# Altium footprint library OT Library.PcbLib: 396 footprints (part 17 of 25)
Each footprint in its own frame and in the unit in brackets; x right, y up, seen from the top. Pads: shape width x height; smd on the part's side, far side on the other; paste and mask are expansions set on the pad; w line width, h text height; cw(c..) or ccw(c..) is an arc to the next point about the centre after c.
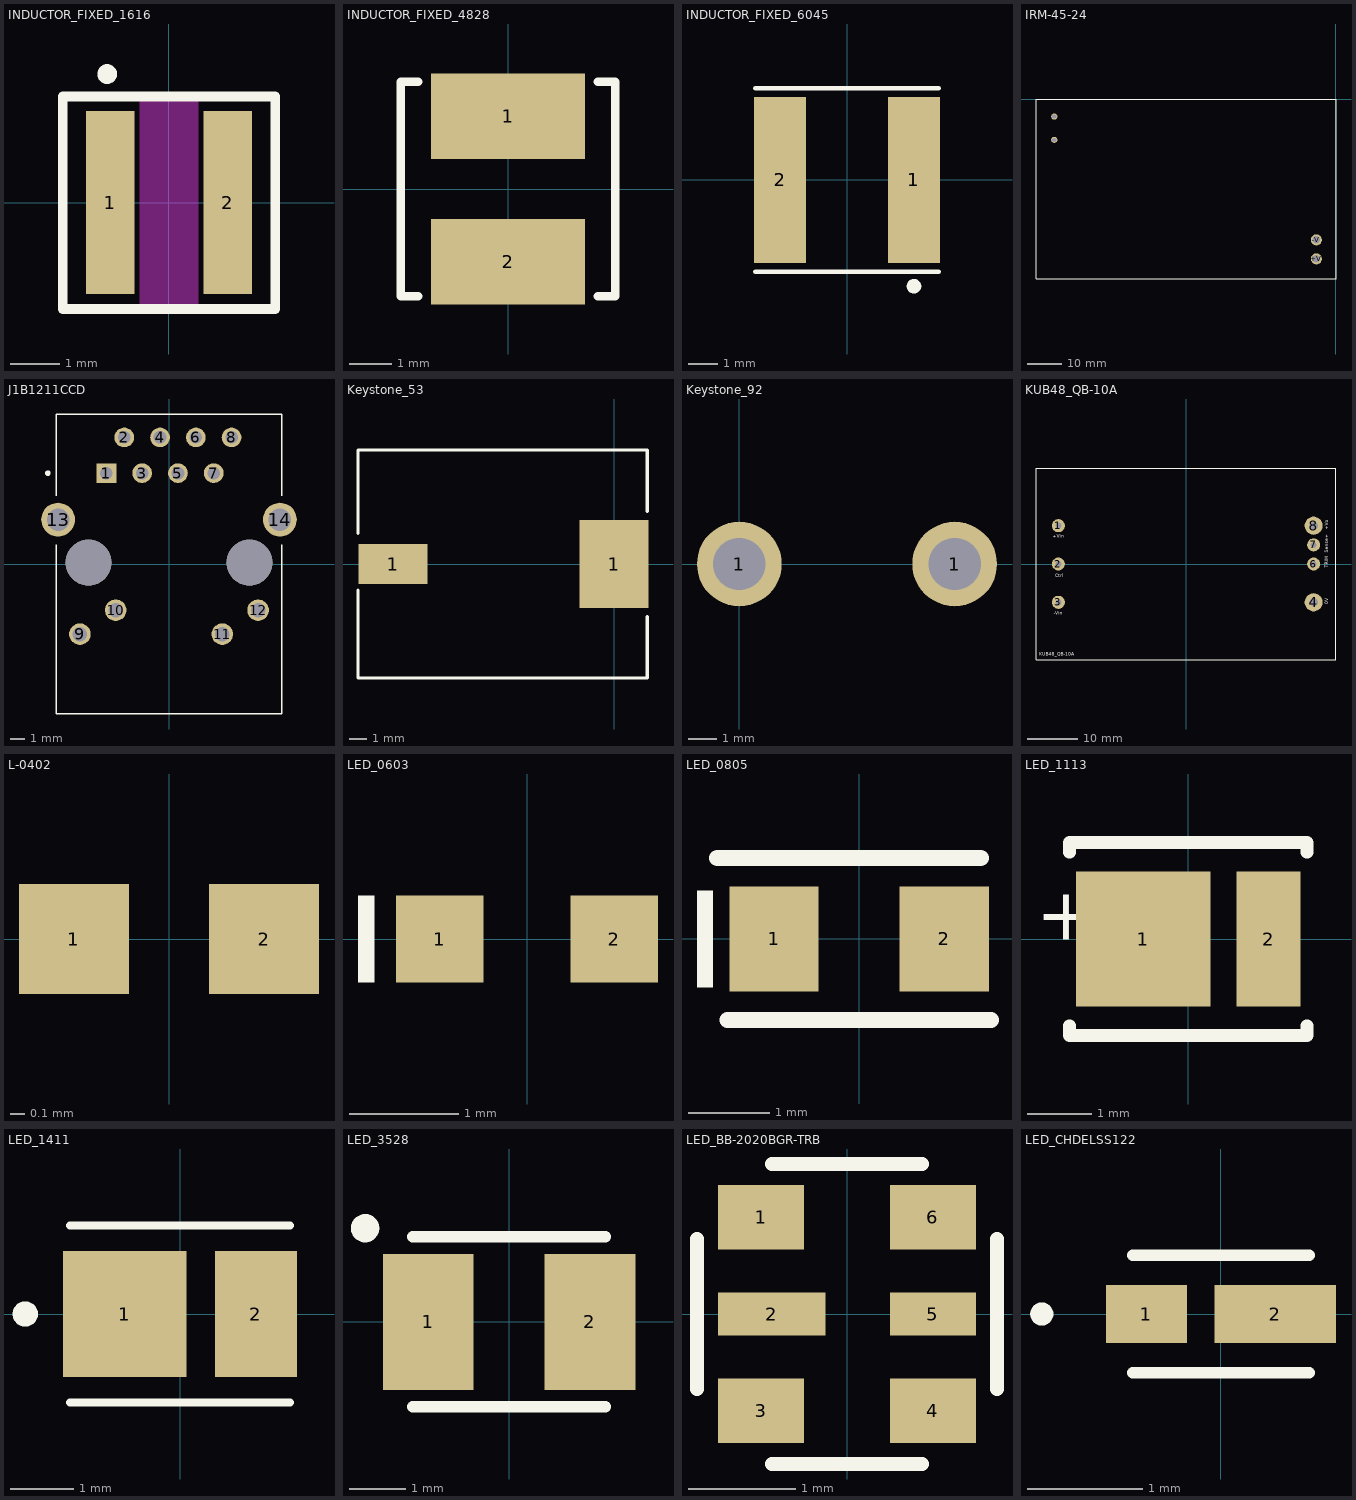
[diagram p16: the footprints below, top view; thin cyan lines are the x and y axes]

## INDUCTOR_FIXED_1616 [mm] "0.161\" L x 0.161\" W (4.10mm x 4.10mm)"
height 2.1
pads (2):
  rect 0.98x3.7 smd: 1(-1.185,0) 2(1.185,0)
Top Layer keep-out:
  region: -0.595,2.05 0.595,2.05 0.595,-2.05 -0.595,-2.05
Top Overlay:
  circle w0.2: c-1.25,2.6 r0.1
  lines w0.2: -2.15,-2.15 -2.15,2.15 2.15,2.15 2.15,-2.15 -2.15,-2.15
3D body: height 2.1, standoff 0, extent -2.05,-2.05 2.05,2.05

## INDUCTOR_FIXED_4828 [mm] "SMT Power Inductor, body 4.8x4.8mm"
height 2.8
pads (2):
  rect 3.6x2 smd: 1(0,1.7) 2(0,-1.7)
Top Overlay:
  lines w0.2: -2.1,-2.5 -2.5,-2.5 -2.5,2.5 -2.1,2.5 ; 2.1,-2.5 2.5,-2.5 2.5,2.5 2.1,2.5
3D body: height 2.8, standoff 0, extent -2.4,-2.4 2.4,2.4

## INDUCTOR_FIXED_6045 [mm] "SMD Power Inductor, 2-Leads, body 6x6mm"
height 4.5
pads (2):
  rect 1.8x5.7 smd: 1(2.3,0) 2(-2.3,0)
Top Overlay:
  circle w0.25: c2.3,-3.65 r0.125
  lines w0.15: -3.15,-3.15 3.15,-3.15 ; -3.15,3.15 3.15,3.15
3D body: height 4.52, standoff 0.02, extent -3,-3 3,3

## IRM-45-24 [mm]
pads (4):
  round 3.216 hole 2.2: +V(-5.7,-46.25) -V(-5.7,-40.75)
  round 1.8 hole 1.2: AC/L(-81.7,-5) AC/N(-81.7,-11.75)
Top Overlay:
  lines w0.2: -86.995,-52 0.005,-52 0.005,0 -86.995,0 -86.995,-52
3D body: height 29.5, standoff -3.5, extent -86.934,-51.731 0.066,0.269

## J1B1211CCD [mm]
pads (16):
  rect 1.4x1.4 / inner round 1.4 / far side rect 1.4x1.4 hole 0.9: 1(-4.445,6.45)
  round 1.4 hole 0.9: 2(-3.175,8.99) 3(-1.905,6.45) 4(-0.635,8.99) 5(0.635,6.45) 6(1.905,8.99) 7(3.175,6.45) 8(4.445,8.99)
  round 1.53 hole 1.02: 9(-6.325,-4.98) 10(-3.785,-3.28) 11(3.785,-4.98) 12(6.325,-3.28)
  round 2.4 hole 1.6: 13(-7.875,3.15) 14(7.875,3.15)
  round 3.25 hole 3.25 unplated: ""(-5.715,0.1) ""(5.715,0.1)
Top Overlay:
  lines w0.1: -8,1.35 -8,-10.65 8,-10.65 8,1.35 ; -8,4.85 -8,10.65 8,10.65 8,4.85
  lines w0.2: -8.6,6.35 cw(c-8.6,6.45) -8.6,6.55 cw(c-8.6,6.45) -8.6,6.35
3D body: height 14.36, standoff -3.95, extent -9.009,-10.625 9.01,10.675

## Keystone_53 [mm]
pads (2):
  rect 4x2.34 smd: 1(-12.81,0)
  rect 4x5.08 smd: 1(0,0)
Top Overlay:
  lines w0.2: -14.842,-1.524 -14.842,-6.604 1.922,-6.604 1.922,-3.048 ; -14.842,1.778 -14.842,6.604 1.922,6.604 1.922,3.048
3D Top:
  text "L=9.08" at -0.618,2.794 h0.4
3D body: height 15.54, standoff -0.1, extent -14.808,-6.655 1.988,6.655

## Keystone_92 [mm]
pads (2):
  round 3 hole 1.85: 1(0,0) 1(7.62,0)
3D body: height 15.63, standoff -3.31, extent -1.901,-6.726 7.632,6.726

## KUB48_QB-10A [mm]
height 4.013
pads (7):
  round 2.6 hole 1.2: 1(-25.4,7.62) 2(-25.4,0) 3(-25.4,-7.62) 6(25.4,0) 7(25.4,3.8)
  round 3.6 hole 1.7: 4(25.4,-7.62) 8(25.4,7.62)
Top Overlay:
  lines w0.2: -29.85,-19.05 -29.85,19.05 29.85,19.05 29.85,-19.05 -29.85,-19.05
  text "KUB48_QB-10A" at -29.25,-18.25 h0.64
  text "+Vin" at -26.5,5.2 h0.64
  text "Ctrl" at -26.05,-2.65 h0.64
  text "-Vin" at -26.35,-10.1 h0.64
  text "0V" at 28.35,-8.05 h0.64
  text "Sense+" at 28.3,2.2 h0.64
  text "TRIM" at 28.35,-0.75 h0.64
  text "+Vo" at 28.35,6.85 h0.64
3D body: height 13, standoff -4.7, extent -29.6,-18.8 29.6,18.8
3D body: height 15.4, standoff -2.3, extent -29.6,-18.796 29.6,18.804

## L-0402 [mm] "Chip Inductor; Body 1.6 x 0.8 mm (LxW typ)"
height 0.85
pads (2):
  rect 0.75x0.75 smd: 1(-0.65,0) 2(0.65,0)
3D body: height 0.75, standoff -0.01, extent -0.762,-0.381 0.762,0.381

## LED_0603 [mm] "SMD Mono-color Chip LED, body 1.6x0.8mm"
height 0.7
pads (2):
  rect 0.8x0.8 smd: 1(-0.8,0) 2(0.8,0)
Top Overlay:
  rectangle: -1.55,-0.4 -1.4,0.4
3D body: height 0.7, standoff 0, extent -0.8,-0.4 0.8,0.4

## LED_0805 [mm] "SMD Mono-color Chip LED, body 2.0x1.25mm"
height 0.7
pads (2):
  rect 1.1x1.3 smd: 1(-1.05,0) 2(1.05,0)
Top Overlay:
  rectangle: -2,-0.6 -1.8,0.6
  lines w0.2: -1.75,1 1.5,1 ; -1.625,-1 1.625,-1
Dimensions Top:
  rectangle: -1,-0.625 -0.7,0.625
3D body: height 0.7, standoff 0, extent -1,-0.625 1,0.625

## LED_1113 [mm] "2835 Metric 0.128\" L x 0.110\" W (3.25mm x 2.80mm)"
pads (2):
  rect 2.1x2.1 smd paste+0 mask+0.102: 1(-0.7,0)
  rect 1x2.1 smd paste+0 mask+0.102: 2(1.25,0)
Top Overlay:
  lines w0.2: -1.85,-1.35 -1.85,-1.5 1.85,-1.5 1.85,-1.35 ; -1.85,1.35 -1.85,1.5 1.85,1.5 1.85,1.35
  text "+" at -2.37,-0.01 h0.81
3D Top:
  text "+" at -2.37,-0.01 h0.81
3D body: height 0.8, standoff 0, extent -1.75,-1.4 1.75,1.4

## LED_1411 [mm] "3528 Metric 0.138\" L x 0.110\" W (3.50mm x 2.80mm)"
height 0.8
pads (2):
  rect 1.95x2 smd: 1(-0.875,0)
  rect 1.3x2 smd: 2(1.2,0)
Top Overlay:
  circle w0.2: c-2.45,0 r0.1
  lines w0.127: -1.74,-1.4 1.74,-1.4 ; -1.74,1.4 1.74,1.4
3D body: height 0.7, standoff 0, extent -1.74,-1.4 1.74,1.4

## LED_3528 [mm] "SMD Mono-color TOP LED, body 3.2x2.8mm"
height 1.9
pads (2):
  rect 1.6x2.4 smd: 1(-1.425,0) 2(1.425,0)
Top Overlay:
  circle w0.25: c-2.54,1.651 r0.125
  lines w0.2: -1.7,-1.5 1.7,-1.5 ; -1.7,1.5 1.7,1.5
Test Points Top:
  text ".Designator" at -4.998,-0.333 h1
3D body: height 1.9, standoff 0, extent -1.75,-1.4 1.75,1.4

## LED_BB-2020BGR-TRB [mm]
pads (6):
  rect 0.8x0.6 smd: 1(-0.8,0.9) 3(-0.8,-0.9) 4(0.8,-0.9) 6(0.8,0.9)
  rect 1x0.4 smd: 2(-0.7,0)
  rect 0.8x0.4 smd: 5(0.8,0)
Top Overlay:
  lines w0.127: -1.397,-0.7 -1.397,0 -1.397,0.7 ; -0.7,-1.397 0,-1.397 0.7,-1.397 ; -0.7,1.397 0,1.397 0.7,1.397 ; 1.397,-0.7 1.397,0 1.397,0.7
3D body: height 0.75, standoff 0, extent -1,-1 1,1

## LED_CHDELSS122 [mm] "1.40mm L x 0.80mm W"
height 0.7
pads (2):
  rect 0.7x0.5 smd: 1(-0.645,0)
  rect 1.05x0.5 smd: 2(0.47,0)
Top Overlay:
  lines w0.1: -0.762,-0.508 0.762,-0.508 ; -0.762,0.508 0.762,0.508 ; -1.6,0 ccw(c-1.55,0) -1.5,0 ccw(c-1.55,0) -1.6,0
3D body: height 0.58, standoff -0.02, extent -0.8,-0.4 0.8,0.4